# Altium footprint library Connectors THD.PcbLib: 631 footprints (part 28 of 46)
Each footprint in its own frame and in the unit in brackets; x right, y up, seen from the top. Pads: shape width x height; smd on the part's side, far side on the other; paste and mask are expansions set on the pad; w line width, h text height; cw(c..) or ccw(c..) is an arc to the next point about the centre after c.
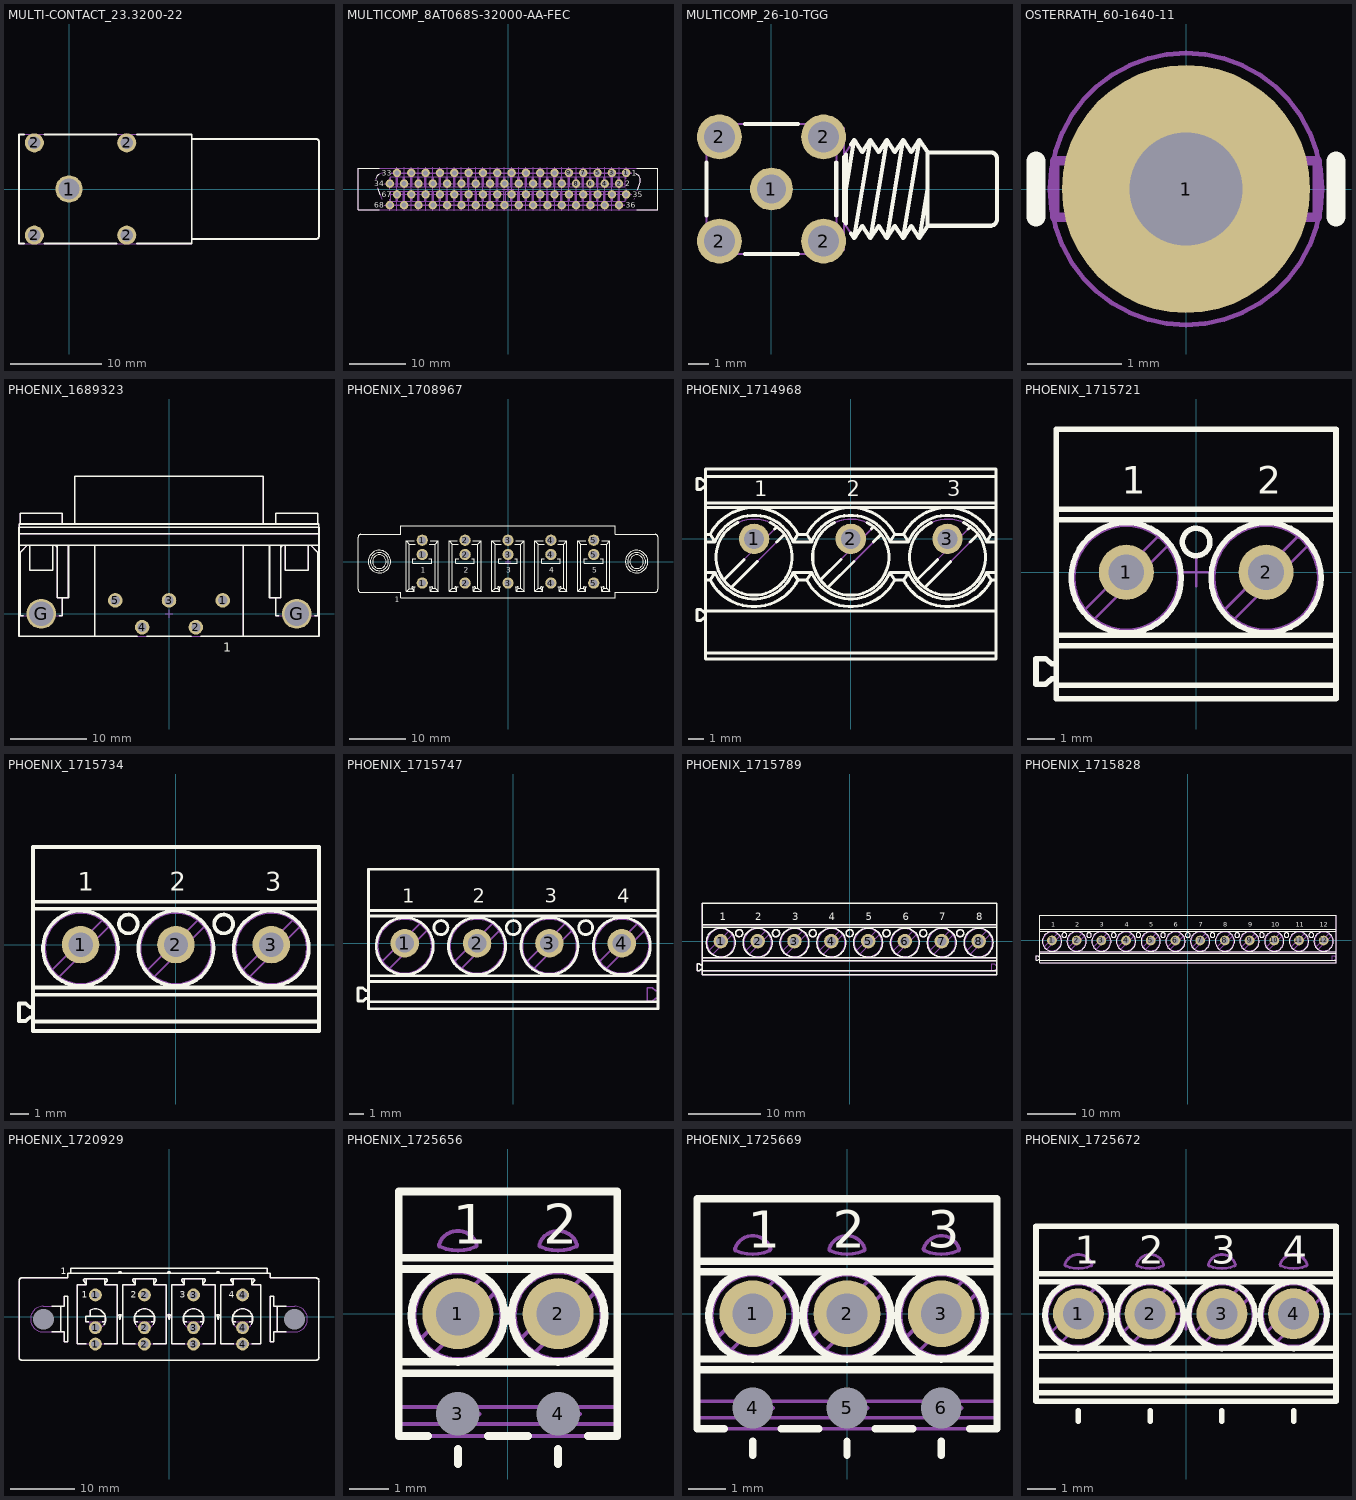
[diagram p27: the footprints below, top view; thin cyan lines are the x and y axes]

## MULTI-CONTACT_23.3200-22 [mm] "Multi-Contact Red Insulated Ø 4mm Angled Socket SLB4-I/90 For Banana 4mm"
height 11.5
pads (5):
  round 3 hole 2.3: 1(0,0)
  round 2.1 hole 1.4: 2(-3.81,-5.08) 2(-3.81,5.08) 2(6.35,-5.08) 2(6.35,5.08)
Top Overlay:
  lines w0.2: -4.931,-6 -5.5,-6 -5.5,6 -4.931,6 ; -2.689,-6 5.229,-6 ; -2.689,6 5.229,6 ; 7.471,-6 13.5,-6 13.5,6 7.471,6 ; 13.5,-5.5 27.2,-5.5 ccw(c27.2,-5.2) 27.5,-5.2 27.5,5.2 ccw(c27.2,5.2) 27.2,5.5 13.5,5.5
Mechanical 8:
  lines w0.1: -4.81,-5.08 -3.81,-5.08 ; -4.81,5.08 -3.81,5.08 ; -3.81,-6.08 -3.81,-5.08 ; -3.81,-4.08 -3.81,-5.08 ; -3.81,4.08 -3.81,5.08 ; -3.81,6.08 -3.81,5.08 ; -2.81,-5.08 -3.81,-5.08 ; -2.81,5.08 -3.81,5.08 ; -1,0 0,0 ; 0,-1 0,0 ; 0,1 0,0 ; 1,0 0,0 ; 5.35,-5.08 6.35,-5.08 ; 5.35,5.08 6.35,5.08 ; 6.35,-6.08 6.35,-5.08 ; 6.35,-4.08 6.35,-5.08 ; 6.35,4.08 6.35,5.08 ; 6.35,6.08 6.35,5.08 ; 7.35,-5.08 6.35,-5.08 ; 7.35,5.08 6.35,5.08
Mechanical 14:
  lines w0.1: 13.5,-5.5 27.2,-5.5 ccw(c27.2,-5.2) 27.5,-5.2 27.5,5.2 ccw(c27.2,5.2) 27.2,5.5 13.5,5.5 ; -5.5,-6 -5.5,6 13.5,6 13.5,-6 -5.5,-6
3D body: height 12.3, standoff -3.4, extent -5.5,-6 27.5,6

## MULTICOMP_8AT068S-32000-AA-FEC [mm] "68 Way,  Pitch .050\", D-Type SCSI2, Through-hole Vertical Socket"
height 8.4
pads (68):
  round 1.5 hole 0.9: 1(20.955,2.858) 2(19.685,0.953) 3(18.415,2.858) 4(17.145,0.953) 5(15.875,2.858) 6(14.605,0.953) 7(13.335,2.858) 8(12.065,0.953) 9(10.795,2.858) 10(9.525,0.953) 11(8.255,2.858) 12(6.985,0.953) 13(5.715,2.858) 14(4.445,0.953) 15(3.175,2.858) 16(1.905,0.953) 17(0.635,2.858) 18(-0.635,0.953) 19(-1.905,2.858) 20(-3.175,0.953) 21(-4.445,2.858) 22(-5.715,0.953) 23(-6.985,2.858) 24(-8.255,0.953) 25(-9.525,2.858) 26(-10.795,0.953) 27(-12.065,2.858) 28(-13.335,0.953) 29(-14.605,2.858) 30(-15.875,0.953) 31(-17.145,2.858) 32(-18.415,0.953) 33(-19.685,2.858) 34(-20.955,0.953) 35(20.955,-0.952) 36(19.685,-2.857) 37(18.415,-0.952) 38(17.145,-2.857) 39(15.875,-0.952) 40(14.605,-2.857) 41(13.335,-0.952) 42(12.065,-2.857) 43(10.795,-0.952) 44(9.525,-2.857) 45(8.255,-0.952) 46(6.985,-2.857) 47(5.715,-0.952) 48(4.445,-2.857) 49(3.175,-0.952) 50(1.905,-2.857) 51(0.635,-0.952) 52(-0.635,-2.857) 53(-1.905,-0.952) 54(-3.175,-2.857) 55(-4.445,-0.952) 56(-5.715,-2.857) 57(-6.985,-0.952) 58(-8.255,-2.857) 59(-9.525,-0.952) 60(-10.795,-2.857) 61(-12.065,-0.952) 62(-13.335,-2.857) 63(-14.605,-0.952) 64(-15.875,-2.857) 65(-17.145,-0.952) 66(-18.415,-2.857) 67(-19.685,-0.952) 68(-20.955,-2.857)
Top Overlay:
  lines w0.2: -23.443,1.89 cw(c-22.234,1.5) -22.873,2.597 ; -23.083,0.089 -22.709,-1.012 ; -22.8,-3.65 -26.6,-3.65 -26.6,3.65 -22.8,3.65 ; 22.614,2.709 cw(c22.225,1.5) 23.452,1.171 23.017,-0.106 ; 22.8,-3.65 26.6,-3.65 26.6,3.65 22.8,3.65
  text "1" at 21.975,2.358 h1
  text "2" at 20.793,0.453 h1
  text "35" at 22.139,-1.453 h1
  text "36" at 20.865,-3.358 h1
  text "34" at -23.685,0.453 h1
  text "33" at -22.386,2.358 h1
  text "67" at -22.385,-1.478 h1
  text "68" at -23.705,-3.358 h1
Mechanical 8:
  drawing of 798 lines, arcs and shapes, not listed
Mechanical 14:
  drawing of 275 lines, arcs and shapes, not listed
  text "1" at 21.975,2.358 h1
  text "2" at 20.793,0.453 h1
  text "35" at 22.139,-1.453 h1
  text "36" at 20.865,-3.358 h1
  text "34" at -23.685,0.453 h1
  text "33" at -22.386,2.358 h1
  text "67" at -22.385,-1.478 h1
  text "68" at -23.705,-3.358 h1
3D body: height 8.4, standoff -3.6, extent -26.6,-3.65 26.6,3.65

## MULTICOMP_26-10-TGG [mm] "50 Ohm Right Angle PCB Mount SMC Jack Receptacle"
height 7.1
pads (5):
  round 2.1 hole 1.4: 1(0,0)
  round 2.2 hole 1.5: 2(-2.55,-2.55) 2(-2.55,2.55) 2(2.55,-2.55) 2(2.55,2.55)
Top Overlay:
  lines w0.2: -3.175,-1.297 -3.175,1.297 ; -1.297,-3.175 1.297,-3.175 ; -1.297,3.175 1.297,3.175 ; 3.175,-1.297 3.175,1.297 ; 3.55,-1.57 3.55,1.57 ; 3.65,-1.684 3.65,1.684 ; 3.65,0 4.05,2.41 ; 3.903,-2.189 4.05,-2.41 ; 3.903,2.189 4.05,2.41 ; 7.65,-1.8 10.75,-1.8 ; 7.65,0 7.25,-2.41 ; 7.65,1.79 10.75,1.79 cw(c10.75,1.49) 11.05,1.49 ; 10.75,-1.79 ccw(c10.75,-1.49) 11.05,-1.49 ; 11.05,-1.5 11.05,1.5 ; 4.05,-2.41 4.45,-1.81 4.85,-2.41 ; 4.05,-2.41 4.85,2.41 ; 4.05,2.41 4.45,1.81 4.85,2.41 ; 4.85,-2.41 5.25,-1.81 5.65,-2.41 ; 4.85,-2.41 5.65,2.41 ; 4.85,2.41 5.25,1.81 5.65,2.41 ; 5.65,-2.41 6.05,-1.81 6.45,-2.41 ; 5.65,-2.41 6.45,2.41 ; 5.65,2.41 6.05,1.81 6.45,2.41 ; 6.45,-2.41 6.85,-1.81 7.25,-2.41 ; 6.45,-2.41 7.25,2.41 ; 6.45,2.41 6.85,1.81 7.25,2.41 ; 7.25,-2.41 7.65,-1.81 ; 7.25,2.41 7.65,1.81 ; 7.65,-1.81 7.65,1.81 ; 7.65,-1.81 7.65,1.81
Mechanical 8:
  lines w0.1: -3.05,-2.55 -2.55,-2.55 ; -3.05,2.55 -2.55,2.55 ; -2.55,-3.05 -2.55,-2.55 ; -2.55,-2.05 -2.55,-2.55 ; -2.55,2.05 -2.55,2.55 ; -2.55,3.05 -2.55,2.55 ; -2.05,-2.55 -2.55,-2.55 ; -2.05,2.55 -2.55,2.55 ; -0.5,0 0,0 ; 0,-0.5 0,0 ; 0,0.5 0,0 ; 0.5,0 0,0 ; 2.05,-2.55 2.55,-2.55 ; 2.05,2.55 2.55,2.55 ; 2.55,-3.05 2.55,-2.55 ; 2.55,-2.05 2.55,-2.55 ; 2.55,2.05 2.55,2.55 ; 2.55,3.05 2.55,2.55 ; 3.05,-2.55 2.55,-2.55 ; 3.05,2.55 2.55,2.55
Mechanical 14:
  lines w0.1: 3.175,-3 3.55,-3 3.55,3 3.175,3 ; 3.55,-1.81 3.65,-1.81 ; 3.55,1.81 3.65,1.81 ; 3.65,0 4.05,2.41 ; 7.65,-1.8 10.75,-1.8 ; 7.65,0 7.25,-2.41 ; 7.65,1.79 10.75,1.79 cw(c10.75,1.49) 11.05,1.49 ; 10.75,-1.79 ccw(c10.75,-1.49) 11.05,-1.49 ; 11.05,-1.5 11.05,1.5 ; 3.65,-1.81 4.05,-2.41 ; 3.65,-1.81 3.65,1.81 ; 3.65,1.81 4.05,2.41 ; 4.05,-2.41 4.45,-1.81 4.85,-2.41 ; 4.05,-2.41 4.85,2.41 ; 4.05,2.41 4.45,1.81 4.85,2.41 ; 4.85,-2.41 5.25,-1.81 5.65,-2.41 ; 4.85,-2.41 5.65,2.41 ; 4.85,2.41 5.25,1.81 5.65,2.41 ; 5.65,-2.41 6.05,-1.81 6.45,-2.41 ; 5.65,-2.41 6.45,2.41 ; 5.65,2.41 6.05,1.81 6.45,2.41 ; 6.45,-2.41 6.85,-1.81 7.25,-2.41 ; 6.45,-2.41 7.25,2.41 ; 6.45,2.41 6.85,1.81 7.25,2.41 ; 7.25,-2.41 7.65,-1.81 ; 7.25,2.41 7.65,1.81 ; 7.65,-1.81 7.65,1.81 ; 7.65,-1.81 7.65,1.81 ; -3.175,-3.175 3.175,-3.175 3.175,3.175 -3.175,3.175 -3.175,-3.175
3D body: height 7.1, standoff -3.9, extent -3.175,-3.175 11.05,3.175

## OSTERRATH_60-1640-11 [mm] "Soldering Tag for Printed Circuit"
height 5.6
pads (1):
  round 2.65 hole 1.2: 1(0,0)
Top Overlay:
  lines w0.2: -1.6,-0.3 -1.6,0.3 ; 1.6,-0.3 1.6,0.3
Mechanical 14:
  lines w0.1: -0.9,-0.3 -0.9,0.3 ; 0.9,-0.3 0.9,0.3 ; -1.4,-0.3 1.4,-0.3 1.4,0.3 -1.4,0.3 -1.4,-0.3
Mechanical 15:
  circle w0.05: c0,0 r1.45
3D body: height 5.6, standoff -3, extent -1.4,-0.3 1.4,0.3

## PHOENIX_1689323 [mm] "Pitch 3.5mm, 5-Positions POWER-SUBCON Shielded Header, With Capacitive  Ground Connection"
height 13.7
pads (7):
  round 1.9 hole 1.2: 1(7,1.75) 2(3.5,-1.75) 3(0,1.75) 4(-3.5,-1.75) 5(-7,1.75)
  round 3.9 hole 3.2: G(-16.65,0) G(16.65,0)
Top Overlay:
  lines w0.2: -19.55,8.95 19.55,8.95 ; -19.55,10.45 19.55,10.45 ; -19.54,11.25 -19.54,11.7 19.54,11.7 19.54,11.25 ; -19.4,11.7 -19.4,13.105 -13.9,13.105 -13.9,11.7 ; -18.984,-0.275 -19.4,-0.275 -19.4,8 -18.45,8.95 ; -18.15,8.95 -18.15,5.7 -15.15,5.7 -15.15,8.95 ; -14.85,8.95 -14.55,8.65 ; -14.55,8.95 -14.55,2.1 -13.1,2.1 -13.1,8.95 ; -14.316,-0.275 -13.9,-0.275 -13.9,2.1 ; -12.299,11.7 -12.299,17.9 ; -12.26,17.9 12.299,17.9 12.299,11.7 ; -9.7,-2.95 -9.7,8.95 ; -4.118,-2.95 -19.55,-2.95 -19.55,11.25 19.55,11.25 19.55,-2.95 4.118,-2.95 ; -2.882,-2.95 2.882,-2.95 ; 9.7,-2.95 9.7,8.95 ; 13.1,8.95 13.1,2.1 14.55,2.1 14.55,8.95 ; 13.9,2.1 13.9,-0.275 14.316,-0.275 ; 13.9,11.7 13.9,13.105 19.4,13.105 19.4,11.7 ; 14.55,8.65 14.85,8.95 ; 15.15,8.95 15.15,5.7 18.15,5.7 18.15,8.95 ; 18.45,8.95 19.4,8 19.4,-0.275 18.984,-0.275
  text "1" at 7.05,-4.925 h1.2
Mechanical 8:
  lines w0.1: -17.15,0 -16.65,0 ; -16.65,-0.5 -16.65,0 ; -16.65,0.5 -16.65,0 ; -16.15,0 -16.65,0 ; -7.5,1.75 -7,1.75 ; -7,1.25 -7,1.75 ; -7,2.25 -7,1.75 ; -6.5,1.75 -7,1.75 ; -4,-1.75 -3.5,-1.75 ; -3.5,-2.25 -3.5,-1.75 ; -3.5,-1.25 -3.5,-1.75 ; -3,-1.75 -3.5,-1.75 ; -0.5,0 0,0 ; -0.5,1.75 0,1.75 ; 0,-0.5 0,0 ; 0,0.5 0,0 ; 0,1.25 0,1.75 ; 0,2.25 0,1.75 ; 0.5,0 0,0 ; 0.5,1.75 0,1.75 ; 3,-1.75 3.5,-1.75 ; 3.5,-2.25 3.5,-1.75 ; 3.5,-1.25 3.5,-1.75 ; 4,-1.75 3.5,-1.75 ; 6.5,1.75 7,1.75 ; 7,1.25 7,1.75 ; 7,2.25 7,1.75 ; 7.5,1.75 7,1.75 ; 16.15,0 16.65,0 ; 16.65,-0.5 16.65,0 ; 16.65,0.5 16.65,0 ; 17.15,0 16.65,0
Mechanical 14:
  lines w0.1: -19.55,8.95 19.55,8.95 ; -19.55,10.45 19.55,10.45 ; -19.54,11.25 -19.54,11.7 19.54,11.7 19.54,11.25 ; -19.4,11.7 -19.4,13.105 -13.9,13.105 -13.9,11.7 ; -18.45,8.95 -19.4,8 -19.4,-0.275 -13.9,-0.275 -13.9,2.1 ; -18.15,8.95 -18.15,5.7 -15.15,5.7 -15.15,8.95 ; -14.85,8.95 -14.55,8.65 ; -14.55,8.95 -14.55,2.1 -13.1,2.1 -13.1,8.95 ; -12.299,11.7 -12.299,17.9 ; -12.26,17.9 12.299,17.9 12.299,11.7 ; -9.7,-2.95 -9.7,8.95 ; 9.7,-2.95 9.7,8.95 ; 13.1,8.95 13.1,2.1 14.55,2.1 14.55,8.95 ; 13.9,2.1 13.9,-0.275 19.4,-0.275 19.4,8 18.45,8.95 ; 13.9,11.7 13.9,13.105 19.4,13.105 19.4,11.7 ; 14.55,8.65 14.85,8.95 ; 15.15,8.95 15.15,5.7 18.15,5.7 18.15,8.95 ; -19.55,-2.95 19.55,-2.95 19.55,11.25 -19.55,11.25 -19.55,-2.95
  text "1" at 7.05,-4.925 h1.2
3D body: height 13.65, standoff -4.1, extent -19.55,-2.95 19.55,17.9

## PHOENIX_1708967 [mm] "PCB Header, 41A, 630V, Pitch: 7.62mm, 5 Positions, IPCV Serie"
height 30.1
pads (15):
  round 2 hole 1.3: 1(-15.24,-3.82) 1(-15.24,1.26) 1(-15.24,3.8) 2(-7.62,-3.82) 2(-7.62,1.26) 2(-7.62,3.8) 3(0,-3.82) 3(0,1.26) 3(0,3.8) 4(7.62,-3.82) 4(7.62,1.26) 4(7.62,3.8) 5(15.24,-3.82) 5(15.24,1.26) 5(15.24,3.8)
Top Overlay:
  drawing of 187 lines, arcs and shapes, not listed
  text "1" at -20.11,-7.255 h1
  text "5" at 14.955,-1.97 h1
  text "4" at 7.335,-2.025 h1
  text "3" at -0.285,-2.025 h1
  text "2" at -7.905,-2.025 h1
  text "1" at -15.525,-2.025 h1
Mechanical 8:
  lines w0.1: -15.74,-3.82 -15.24,-3.82 ; -15.74,1.26 -15.24,1.26 ; -15.74,3.8 -15.24,3.8 ; -15.24,-4.32 -15.24,-3.82 ; -15.24,-3.32 -15.24,-3.82 ; -15.24,0.76 -15.24,1.26 ; -15.24,1.76 -15.24,1.26 ; -15.24,3.3 -15.24,3.8 ; -15.24,4.3 -15.24,3.8 ; -14.74,-3.82 -15.24,-3.82 ; -14.74,1.26 -15.24,1.26 ; -14.74,3.8 -15.24,3.8 ; -8.12,-3.82 -7.62,-3.82 ; -8.12,1.26 -7.62,1.26 ; -8.12,3.8 -7.62,3.8 ; -7.62,-4.32 -7.62,-3.82 ; -7.62,-3.32 -7.62,-3.82 ; -7.62,0.76 -7.62,1.26 ; -7.62,1.76 -7.62,1.26 ; -7.62,3.3 -7.62,3.8 ; -7.62,4.3 -7.62,3.8 ; -7.12,-3.82 -7.62,-3.82 ; -7.12,1.26 -7.62,1.26 ; -7.12,3.8 -7.62,3.8 ; -0.5,-3.82 0,-3.82 ; -0.5,0 0,0 ; -0.5,1.26 0,1.26 ; -0.5,3.8 0,3.8 ; 0,-4.32 0,-3.82 ; 0,-3.32 0,-3.82 ; 0,-0.5 0,0 ; 0,0.5 0,0 ; 0,0.76 0,1.26 ; 0,1.76 0,1.26 ; 0,3.3 0,3.8 ; 0,4.3 0,3.8 ; 0.5,-3.82 0,-3.82 ; 0.5,0 0,0 ; 0.5,1.26 0,1.26 ; 0.5,3.8 0,3.8 ; 7.12,-3.82 7.62,-3.82 ; 7.12,1.26 7.62,1.26 ; 7.12,3.8 7.62,3.8 ; 7.62,-4.32 7.62,-3.82 ; 7.62,-3.32 7.62,-3.82 ; 7.62,0.76 7.62,1.26 ; 7.62,1.76 7.62,1.26 ; 7.62,3.3 7.62,3.8 ; 7.62,4.3 7.62,3.8 ; 8.12,-3.82 7.62,-3.82 ; 8.12,1.26 7.62,1.26 ; 8.12,3.8 7.62,3.8 ; 14.74,-3.82 15.24,-3.82 ; 14.74,1.26 15.24,1.26 ; 14.74,3.8 15.24,3.8 ; 15.24,-4.32 15.24,-3.82 ; 15.24,-3.32 15.24,-3.82 ; 15.24,0.76 15.24,1.26 ; 15.24,1.76 15.24,1.26 ; 15.24,3.3 15.24,3.8 ; 15.24,4.3 15.24,3.8 ; 15.74,-3.82 15.24,-3.82 ; 15.74,1.26 15.24,1.26 ; 15.74,3.8 15.24,3.8
Mechanical 14:
  text "1" at -20.11,-7.255 h1
  text "5" at 14.955,-1.97 h1
  text "4" at 7.335,-2.025 h1
  text "3" at -0.285,-2.025 h1
  text "2" at -7.905,-2.025 h1
  text "1" at -15.525,-2.025 h1
3D body: height 30.1, standoff -5, extent -26.66,-6.4 26.66,6.4

## PHOENIX_1714968 [mm] "Terminal Block, 30A 300V, Pitch 6.35mm, 3 Positions, Screw Connection"
height 21.5
pads (3):
  round 2 hole 1.3: 1(-6.35,0) 2(0,0) 3(6.35,0)
Top Overlay:
  lines w0.2: -9.525,-7.5 9.525,-7.5 ; -9.525,-5.207 -9.654,-5.207 -9.832,-5.357 -10.095,-5.357 -10.095,-4.643 -9.832,-4.643 -9.654,-4.793 -9.525,-4.793 ; -9.525,-4.729 9.525,-4.729 ; -9.525,-2.7 -9.233,-2.7 ; -9.525,-2.2 -8.912,-2.2 ; -9.525,-0.2 -8.912,-0.2 ; -9.525,0.3 -9.233,0.3 ; -9.525,2.05 9.525,2.05 ; -9.525,2.354 9.525,2.354 ; -9.525,3.393 -9.654,3.393 -9.832,3.243 -10.095,3.243 -10.095,3.957 -9.832,3.957 -9.654,3.807 -9.525,3.807 ; -9.525,4.1 9.525,4.1 ; -8.348,-2.703 -6.998,-1.353 ; -7.853,-3.198 -6.14,-1.485 ; -7.405,1.067 ccw(c-6.35,-1.2) -5.295,1.067 ; -4.997,0.648 -4.847,0.798 ; -4.865,-0.21 -4.352,0.303 ; -1.998,-2.703 -0.648,-1.353 ; -1.503,-3.198 0.21,-1.485 ; -1.055,1.067 ccw(c0,-1.2) 1.055,1.067 ; 1.353,0.648 1.503,0.798 ; 1.485,-0.21 1.998,0.303 ; 4.352,-2.703 5.702,-1.353 ; 4.847,-3.198 6.56,-1.485 ; 5.295,1.067 ccw(c6.35,-1.2) 7.405,1.067 ; 7.703,0.648 7.853,0.798 ; 7.835,-0.21 8.348,0.303 ; 9.525,-2.7 9.233,-2.7 ; 9.525,-2.2 8.912,-2.2 ; 9.525,-0.2 8.912,-0.2 ; 9.525,0.3 9.233,0.3 ; -9.233,-2.7 ccw(c-6.35,-1.2) -3.467,-2.7 ; -9.233,-2.7 -8.912,-2.2 ; -9.233,0.3 cw(c-6.35,-1.2) -3.467,0.3 ; -9.233,0.3 -8.912,-0.2 ; -8.912,-2.2 ccw(c-6.35,-1.2) -3.788,-2.2 ; -8.912,-0.2 cw(c-6.35,-1.2) -3.788,-0.2 ; -3.788,-2.2 -2.562,-2.2 ; -3.788,-2.2 -3.467,-2.7 ; -3.788,-0.2 -3.467,0.3 ; -3.788,-0.2 -2.562,-0.2 ; -3.467,-2.7 -2.883,-2.7 ; -3.467,0.3 -2.883,0.3 ; -2.883,-2.7 ccw(c0,-1.2) 2.883,-2.7 ; -2.883,-2.7 -2.562,-2.2 ; -2.883,0.3 cw(c0,-1.2) 2.883,0.3 ; -2.883,0.3 -2.562,-0.2 ; -2.562,-2.2 ccw(c0,-1.2) 2.562,-2.2 ; -2.562,-0.2 cw(c0,-1.2) 2.562,-0.2 ; 2.562,-2.2 3.788,-2.2 ; 2.562,-2.2 2.883,-2.7 ; 2.562,-0.2 2.883,0.3 ; 2.562,-0.2 3.788,-0.2 ; 2.883,-2.7 3.467,-2.7 ; 2.883,0.3 3.467,0.3 ; 3.467,-2.7 ccw(c6.35,-1.2) 9.233,-2.7 ; 3.467,-2.7 3.788,-2.2 ; 3.467,0.3 cw(c6.35,-1.2) 9.233,0.3 ; 3.467,0.3 3.788,-0.2 ; 3.788,-2.2 ccw(c6.35,-1.2) 8.912,-2.2 ; 3.788,-0.2 cw(c6.35,-1.2) 8.912,-0.2 ; 8.912,-2.2 9.233,-2.7 ; 8.912,-0.2 9.233,0.3 ; -9.525,-7.9 -9.525,4.6 9.525,4.6 9.525,-7.9 -9.525,-7.9
  text "1" at -6.35,2.8 h1
  text "2" at -0.279,2.8 h1
  text "3" at 6.35,2.8 h1
Mechanical 8:
  lines w0.1: -6.85,0 -6.35,0 ; -6.35,-0.5 -6.35,0 ; -6.35,0.5 -6.35,0 ; -5.85,0 -6.35,0 ; -0.5,0 0,0 ; 0,-0.5 0,0 ; 0,0.5 0,0 ; 0.5,0 0,0 ; 5.85,0 6.35,0 ; 6.35,-0.5 6.35,0 ; 6.35,0.5 6.35,0 ; 6.85,0 6.35,0
Mechanical 14:
  circle w0.1: c-6.35,-1.2 r2.5
  circle w0.1: c0,-1.2 r2.5
  circle w0.1: c6.35,-1.2 r2.5
  lines w0.1: -9.525,-7.5 9.525,-7.5 ; -9.525,-5.207 -9.654,-5.207 -9.832,-5.357 -10.095,-5.357 -10.095,-4.643 -9.832,-4.643 -9.654,-4.793 -9.525,-4.793 ; -9.525,-4.729 9.525,-4.729 ; -9.525,-2.7 -9.233,-2.7 ; -9.525,-2.2 -8.912,-2.2 ; -9.525,-0.2 -8.912,-0.2 ; -9.525,0.3 -9.233,0.3 ; -9.525,2.05 9.525,2.05 ; -9.525,2.354 9.525,2.354 ; -9.525,3.393 -9.654,3.393 -9.832,3.243 -10.095,3.243 -10.095,3.957 -9.832,3.957 -9.654,3.807 -9.525,3.807 ; -9.525,4.1 9.525,4.1 ; -8.348,-2.703 -4.847,0.798 ; -7.853,-3.198 -4.352,0.303 ; -1.998,-2.703 1.503,0.798 ; -1.503,-3.198 1.998,0.303 ; 4.352,-2.703 7.853,0.798 ; 4.847,-3.198 8.348,0.303 ; 9.525,-2.7 9.233,-2.7 ; 9.525,-2.2 8.912,-2.2 ; 9.525,-0.2 8.912,-0.2 ; 9.525,0.3 9.233,0.3 ; -9.233,-2.7 ccw(c-6.35,-1.2) -3.467,-2.7 ; -9.233,-2.7 -8.912,-2.2 ; -9.233,0.3 cw(c-6.35,-1.2) -3.467,0.3 ; -9.233,0.3 -8.912,-0.2 ; -8.912,-2.2 ccw(c-6.35,-1.2) -3.788,-2.2 ; -8.912,-0.2 cw(c-6.35,-1.2) -3.788,-0.2 ; -3.788,-2.2 -2.562,-2.2 ; -3.788,-2.2 -3.467,-2.7 ; -3.788,-0.2 -3.467,0.3 ; -3.788,-0.2 -2.562,-0.2 ; -3.467,-2.7 -2.883,-2.7 ; -3.467,0.3 -2.883,0.3 ; -2.883,-2.7 ccw(c0,-1.2) 2.883,-2.7 ; -2.883,-2.7 -2.562,-2.2 ; -2.883,0.3 cw(c0,-1.2) 2.883,0.3 ; -2.883,0.3 -2.562,-0.2 ; -2.562,-2.2 ccw(c0,-1.2) 2.562,-2.2 ; -2.562,-0.2 cw(c0,-1.2) 2.562,-0.2 ; 2.562,-2.2 3.788,-2.2 ; 2.562,-2.2 2.883,-2.7 ; 2.562,-0.2 2.883,0.3 ; 2.562,-0.2 3.788,-0.2 ; 2.883,-2.7 3.467,-2.7 ; 2.883,0.3 3.467,0.3 ; 3.467,-2.7 ccw(c6.35,-1.2) 9.233,-2.7 ; 3.467,-2.7 3.788,-2.2 ; 3.467,0.3 cw(c6.35,-1.2) 9.233,0.3 ; 3.467,0.3 3.788,-0.2 ; 3.788,-2.2 ccw(c6.35,-1.2) 8.912,-2.2 ; 3.788,-0.2 cw(c6.35,-1.2) 8.912,-0.2 ; 8.912,-2.2 9.233,-2.7 ; 8.912,-0.2 9.233,0.3 ; -9.525,-7.9 -9.525,4.6 9.525,4.6 9.525,-7.9 -9.525,-7.9
  text "3" at 6.35,2.8 h1
  text "2" at -0.279,2.8 h1
  text "1" at -6.35,2.8 h1
3D body: height 21.5, standoff -5, extent -10.095,-7.9 9.525,4.6

## PHOENIX_1715721 [mm] "Terminal Block, 17.5A 400V, Pitch 5.08mm, 2 Positions, Screw Connection"
height 13.8
pads (2):
  round 2 hole 1.3: 1(-2.54,0) 2(2.54,0)
Top Overlay:
  circle w0.2: c0,1.1 r0.5
  circle w0.2: c-2.54,-0.2 r2
  circle w0.2: c2.54,-0.2 r2
  lines w0.2: -5.08,-4.1 5.08,-4.1 ; -5.08,-3.869 -5.247,-3.869 -5.479,-4.064 -5.821,-4.064 -5.821,-3.136 -5.479,-3.136 -5.247,-3.331 -5.08,-3.331 ; -5.08,-2.672 5.08,-2.672 ; -5.08,-2.283 5.08,-2.283 ; -5.08,1.909 5.08,1.909 ; -5.08,2.29 5.08,2.29 ; -5.08,-4.6 5.08,-4.6 5.08,5.2 -5.08,5.2 -5.08,-4.6
  text "1" at -2.699,2.857 h1
  text "2" at 2.222,2.857 h1
Mechanical 8:
  lines w0.1: -3.04,0 -2.54,0 ; -2.54,-0.5 -2.54,0 ; -2.54,0.5 -2.54,0 ; -2.04,0 -2.54,0 ; -0.5,0 0,0 ; 0,-0.5 0,0 ; 0,0.5 0,0 ; 0.5,0 0,0 ; 2.04,0 2.54,0 ; 2.54,-0.5 2.54,0 ; 2.54,0.5 2.54,0 ; 3.04,0 2.54,0
Mechanical 14:
  circle w0.1: c2.54,-0.2 r2
  circle w0.1: c-2.54,-0.2 r2
  circle w0.1: c0,1.1 r0.5
  circle w0.1: c2.54,-0.2 r1.891
  circle w0.1: c-2.54,-0.2 r1.891
  lines w0.1: -5.08,-4.1 5.08,-4.1 ; -5.08,-3.869 -5.247,-3.869 -5.479,-4.064 -5.821,-4.064 -5.821,-3.136 -5.479,-3.136 -5.247,-3.331 -5.08,-3.331 ; -5.08,-2.672 5.08,-2.672 ; -5.08,-2.283 5.08,-2.283 ; -5.08,1.909 5.08,1.909 ; -5.08,2.29 5.08,2.29 ; -4.043,-1.349 -1.391,1.303 ; -3.689,-1.703 -1.037,0.949 ; 1.037,-1.349 3.689,1.303 ; 1.391,-1.703 4.043,0.949 ; -5.08,-4.6 -5.08,5.2 5.08,5.2 5.08,-4.6 -5.08,-4.6
  text "1" at -2.699,2.857 h1
  text "2" at 2.222,2.857 h1
3D body: height 14.2, standoff -3.5, extent -5.821,-4.6 5.08,5.2

## PHOENIX_1715734 [mm] "Terminal Block, 17.5A 400V, Pitch 5.08mm, 3 Positions, Screw Connection"
height 13.8
pads (3):
  round 2 hole 1.3: 1(-5.08,0) 2(0,0) 3(5.08,0)
Top Overlay:
  circle w0.2: c-2.54,1.1 r0.5
  circle w0.2: c2.54,1.1 r0.5
  circle w0.2: c-5.08,-0.2 r2
  circle w0.2: c0,-0.2 r2
  circle w0.2: c5.08,-0.2 r2
  lines w0.2: -7.62,-4.1 7.62,-4.1 ; -7.62,-3.869 -7.787,-3.869 -8.019,-4.064 -8.361,-4.064 -8.361,-3.136 -8.019,-3.136 -7.787,-3.331 -7.62,-3.331 ; -7.62,-2.672 7.62,-2.672 ; -7.62,-2.283 7.62,-2.283 ; -7.62,1.909 7.62,1.909 ; -7.62,2.29 7.62,2.29 ; -7.62,-4.6 7.62,-4.6 7.62,5.2 -7.62,5.2 -7.62,-4.6
  text "3" at 4.763,2.857 h1
  text "2" at -0.318,2.857 h1
  text "1" at -5.239,2.857 h1
Mechanical 8:
  lines w0.1: -5.58,0 -5.08,0 ; -5.08,-0.5 -5.08,0 ; -5.08,0.5 -5.08,0 ; -4.58,0 -5.08,0 ; -0.5,0 0,0 ; 0,-0.5 0,0 ; 0,0.5 0,0 ; 0.5,0 0,0 ; 4.58,0 5.08,0 ; 5.08,-0.5 5.08,0 ; 5.08,0.5 5.08,0 ; 5.58,0 5.08,0
Mechanical 14:
  circle w0.1: c5.08,-0.2 r2
  circle w0.1: c0,-0.2 r2
  circle w0.1: c-5.08,-0.2 r2
  circle w0.1: c2.54,1.1 r0.5
  circle w0.1: c-2.54,1.1 r0.5
  circle w0.1: c5.08,-0.2 r1.891
  circle w0.1: c0,-0.2 r1.891
  circle w0.1: c-5.08,-0.2 r1.891
  lines w0.1: -7.62,-4.1 7.62,-4.1 ; -7.62,-3.869 -7.787,-3.869 -8.019,-4.064 -8.361,-4.064 -8.361,-3.136 -8.019,-3.136 -7.787,-3.331 -7.62,-3.331 ; -7.62,-2.672 7.62,-2.672 ; -7.62,-2.283 7.62,-2.283 ; -7.62,1.909 7.62,1.909 ; -7.62,2.29 7.62,2.29 ; -6.583,-1.349 -3.931,1.303 ; -6.229,-1.703 -3.577,0.949 ; -1.503,-1.349 1.149,1.303 ; -1.149,-1.703 1.503,0.949 ; 3.577,-1.349 6.229,1.303 ; 3.931,-1.703 6.583,0.949 ; -7.62,-4.6 -7.62,5.2 7.62,5.2 7.62,-4.6 -7.62,-4.6
  text "3" at 4.763,2.857 h1
  text "2" at -0.318,2.857 h1
  text "1" at -5.239,2.857 h1
3D body: height 14.2, standoff -3.5, extent -8.361,-4.6 7.62,5.2
